# Altium footprint library MH_DA_THU_VIEN_16122016.PcbLib: 531 footprints (part 24 of 34)
Each footprint in its own frame and in the unit in brackets; x right, y up, seen from the top. Pads: shape width x height; smd on the part's side, far side on the other; paste and mask are expansions set on the pad; w line width, h text height; cw(c..) or ccw(c..) is an arc to the next point about the centre after c.
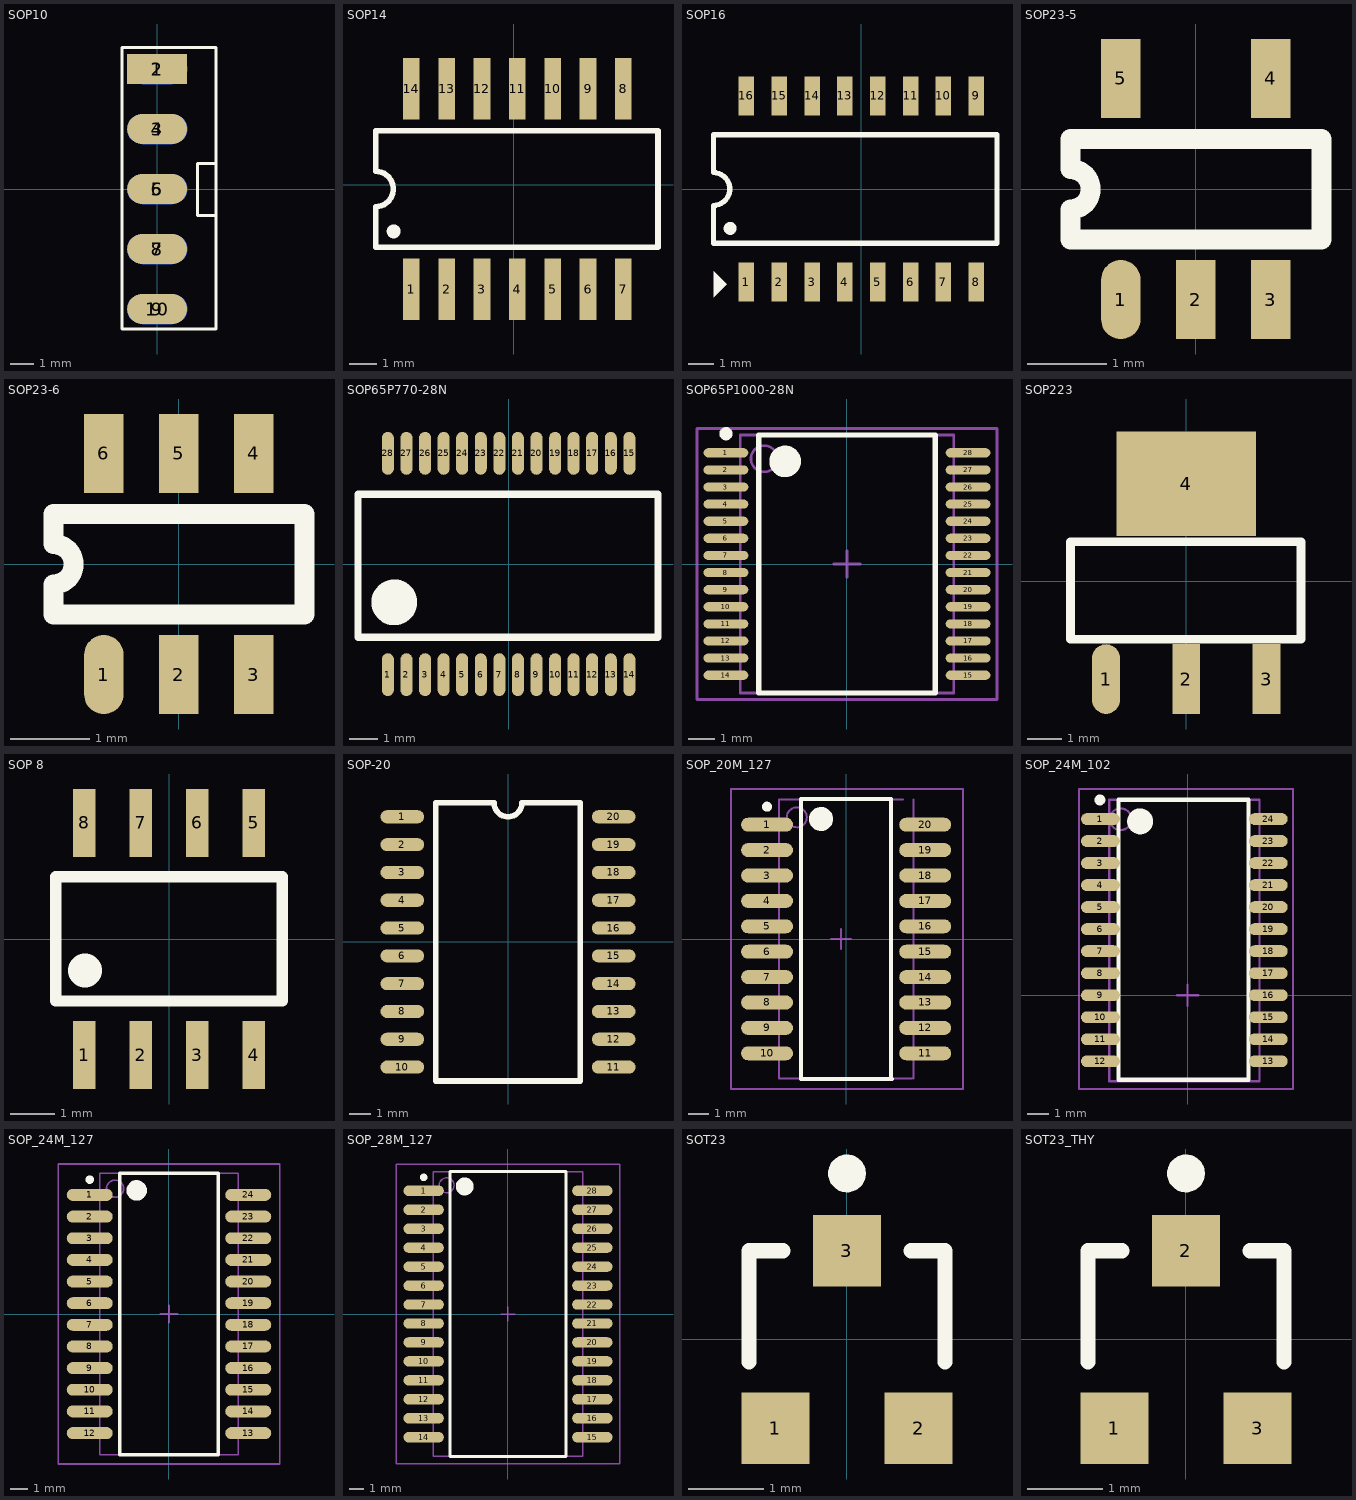
[diagram p23: the footprints below, top view; thin cyan lines are the x and y axes]

## SOP10 [mm] "SOIC 10 hai lop"
height 2.54
pads (10):
  rect 2.54x1.27 smd: 1(0,5.08)
  oval 2.54x1.27 smd far side: 2(0,5.08) 4(0,2.54) 6(0,0) 8(0,-2.54) 10(0,-5.08)
  oval 2.54x1.27 smd: 3(0,2.54) 5(0,0) 7(0,-2.54) 9(0,-5.08)
Top Overlay:
  lines w0.127: 2.497,5.077 2.5,5.075 2.5,-5.82 ; 2.5,-5.72 2.5,-5.92 -1.5,-5.92 -1.5,5.98 2.5,5.98 2.5,5.08 ; 2.5,-1.12 1.7,-1.12 1.7,1.08 2.5,1.08
Mechanical 15:
  lines w0.1: -0.5,5.08 0.5,5.08 ; 0,4.58 0,5.58

## SOP14 [mm]
pads (14):
  rect 0.6x2.2 smd: 1(-3.683,-3.752) 2(-2.413,-3.752) 3(-1.143,-3.752) 4(0.127,-3.752) 5(1.397,-3.752) 6(2.667,-3.752) 7(3.937,-3.752) 8(3.937,3.448) 9(2.667,3.448) 10(1.397,3.448) 11(0.127,3.448) 12(-1.143,3.448) 13(-2.413,3.448) 14(-3.683,3.448)
Top Overlay:
  circle w0.25: c-4.316,-1.676 r0.125
  lines w0.2: -4.963,-2.252 5.182,-2.252 5.182,1.948 -4.963,1.948 -4.963,0.483 cw(c-4.963,-0.152) -4.963,-0.787 -4.963,-2.252

## SOP16 [mm] "Small Outline; 16 Leads; Body Width 5.6 mm; Pitch 1.27 mm"
height 2
pads (16):
  rect 0.6x1.5 smd: 1(-4.445,-3.6) 2(-3.175,-3.6) 3(-1.905,-3.6) 4(-0.635,-3.6) 5(0.635,-3.6) 6(1.905,-3.6) 7(3.175,-3.6) 8(4.445,-3.6) 9(4.445,3.6) 10(3.175,3.6) 11(1.905,3.6) 12(0.635,3.6) 13(-0.635,3.6) 14(-1.905,3.6) 15(-3.175,3.6) 16(-4.445,3.6)
Top Overlay:
  circle w0.25: c-5.078,-1.524 r0.125
  region: -5.715,-4.191 -5.207,-3.683 -5.715,-3.175
  lines w0.2: -5.725,-2.1 -5.725,-0.635 ccw(c-5.725,0) -5.725,0.635 -5.725,2.1 5.25,2.1 5.25,-2.1 -5.725,-2.1
3D body: height 2.1, standoff 0, extent -5.22,-3.627 5.08,3.373

## SOP23-5 [mm]
pads (5):
  oval 0.5x1 smd: 1(-0.95,-1.4)
  rect 0.5x1 smd: 2(0,-1.4) 3(0.95,-1.4) 4(0.95,1.4) 5(-0.95,1.4)
Top Overlay:
  lines w0.254: -1.585,-0.638 -1.585,-0.257 ccw(c-1.585,-0.003) -1.585,0.251 -1.585,0.632 1.59,0.632 1.59,-0.638 -1.585,-0.638

## SOP23-6 [mm]
pads (6):
  oval 0.5x1 smd: 1(-0.95,-1.4)
  rect 0.5x1 smd: 2(0,-1.4) 3(0.95,-1.4) 4(0.95,1.4) 5(0,1.4) 6(-0.95,1.4)
Top Overlay:
  lines w0.254: -1.585,-0.638 -1.585,-0.257 ccw(c-1.585,-0.003) -1.585,0.251 -1.585,0.632 1.59,0.632 1.59,-0.638 -1.585,-0.638
3D body: height 1.45, standoff 0, extent -1.45,-1.4 1.45,1.4

## SOP65P770-28N [mil]
pads (28):
  oval 16.53x59.03 smd mask+7.9: 1(-166.35,-152.5) 2(-140.75,-152.5) 3(-115.17,-152.5) 4(-89.57,-152.5) 5(-63.98,-152.5) 6(-38.38,-152.5) 7(-12.78,-152.5) 8(12.8,-152.5) 9(38.4,-152.5) 10(64,-152.5) 11(89.58,-152.5) 12(115.18,-152.5) 13(140.77,-152.5) 14(166.35,-152.5) 15(166.35,152.5) 16(140.77,152.5) 17(115.18,152.5) 18(89.58,152.5) 19(64,152.5) 20(38.4,152.5) 21(12.8,152.5) 22(-12.78,152.5) 23(-38.38,152.5) 24(-63.98,152.5) 25(-89.57,152.5) 26(-115.17,152.5) 27(-140.75,152.5) 28(-166.35,152.5)
Top Overlay:
  circle w39.37: c-157.55,-52.8 r11.88
  lines w10: -207.57,-100.84 -207.57,96.03 205.86,96.03 205.86,-100.84 -207.57,-100.84
3D body: height 84.65, standoff 0, extent -203.36,-152.49 203.34,152.85

## SOP65P1000-28N [mm] "SOP, 28-Leads, Body 9.7x8mm, Pitch 0.65mm, IPC Medium Density"
height 2
pads (28):
  oval 1.7x0.35 smd: 1(-4.6,4.225) 2(-4.6,3.575) 3(-4.6,2.925) 4(-4.6,2.275) 5(-4.6,1.625) 6(-4.6,0.975) 7(-4.6,0.325) 8(-4.6,-0.325) 9(-4.6,-0.975) 10(-4.6,-1.625) 11(-4.6,-2.275) 12(-4.6,-2.925) 13(-4.6,-3.575) 14(-4.6,-4.225) 15(4.6,-4.225) 16(4.6,-3.575) 17(4.6,-2.925) 18(4.6,-2.275) 19(4.6,-1.625) 20(4.6,-0.975) 21(4.6,-0.325) 22(4.6,0.325) 23(4.6,0.975) 24(4.6,1.625) 25(4.6,2.275) 26(4.6,2.925) 27(4.6,3.575) 28(4.6,4.225)
Top Overlay:
  circle w0.6: c-2.35,3.9 r0.3
  circle w0.25: c-4.6,4.95 r0.125
  lines w0.2: -3.35,-4.9 3.35,-4.9 3.35,4.9 -3.35,4.9 -3.35,-4.9
Mechanical 13:
  circle w0.1: c-3.15,4 r0.5
  lines w0.1: -4.05,-4.9 4.05,-4.9 4.05,4.9 -4.05,4.9 -4.05,-4.9
Mechanical 15:
  lines w0.1: -0.5,0 0.5,0 ; 0,-0.5 0,0.5 ; -5.7,-5.15 5.7,-5.15 5.7,5.15 -5.7,5.15 -5.7,-5.15
3D body: height 2, standoff 0, extent -4.05,-4.9 4.05,4.9

## SOP223 [mm]
pads (4):
  oval 0.8x2 smd: 1(-2.3,-2.8)
  rect 0.8x2 smd: 2(0,-2.8) 3(2.3,-2.8)
  rect 4x3 smd: 4(0,2.8)
Top Overlay:
  lines w0.254: -3.316,-1.657 3.288,-1.657 3.288,1.137 -3.316,1.137 -3.316,-1.657

## SOP 8 [mil]
pads (8):
  rect 20x60 smd: 1(-75,-102.5) 2(-25,-102.5) 3(25,-102.5) 4(75,-102.5) 5(75,102.5) 6(25,102.5) 7(-25,102.5) 8(-75,102.5)
Top Overlay:
  lines w10: -100,-54.81 -100,55.12 100,55.12 100,-54.81 -100,-54.81
  lines w30: -74.03,-27.72 cw(c-78.05,-29.07) -74,-27.82
3D body: height 62.99, standoff 0, extent -97.81,-120.43 99.83,117.44

## SOP-20 [mm]
pads (20):
  oval 2x0.6 smd: 1(-4.826,5.715) 2(-4.826,4.445) 3(-4.826,3.175) 4(-4.826,1.905) 5(-4.826,0.635) 6(-4.826,-0.635) 7(-4.826,-1.905) 8(-4.826,-3.175) 9(-4.826,-4.445) 10(-4.826,-5.715) 11(4.826,-5.715) 12(4.826,-4.445) 13(4.826,-3.175) 14(4.826,-1.905) 15(4.826,-0.635) 16(4.826,0.635) 17(4.826,1.905) 18(4.826,3.175) 19(4.826,4.445) 20(4.826,5.715)
Top Overlay:
  lines w0.254: -3.302,-6.35 3.302,-6.35 3.302,6.35 0.635,6.35 cw(c0,6.35) -0.635,6.35 -3.302,6.35 -3.302,-6.35
3D body: height 2, standoff 0, extent -4.558,-7.112 4.572,7.186

## SOP_20M_127 [mm] "SOP, 20-Leads, Body 13.4x6.2mm, Pitch 1.27mm, IPC Low Density"
height 2
pads (20):
  oval 2.6x0.7 smd: 1(-3.954,5.715) 2(-3.954,4.445) 3(-3.954,3.175) 4(-3.954,1.905) 5(-3.954,0.635) 6(-3.954,-0.635) 7(-3.954,-1.905) 8(-3.954,-3.175) 9(-3.954,-4.445) 10(-3.954,-5.715) 11(3.954,-5.715) 12(3.954,-4.445) 13(3.954,-3.175) 14(3.954,-1.905) 15(3.954,-0.635) 16(3.954,0.635) 17(3.954,1.905) 18(3.954,3.175) 19(3.954,4.445) 20(3.954,5.715)
Top Overlay:
  circle w0.6: c-1.254,6 r0.3
  circle w0.25: c-3.954,6.615 r0.125
  lines w0.2: 2.159,7 -2.254,7 -2.254,-7 2.286,-7 ; 2.254,-7 2.254,7
Mechanical 13:
  circle w0.1: c-2.464,6.085 r0.5
  lines w0.1: 2.856,6.985 -3.364,6.985 -3.364,-6.985 3.302,-6.985 ; 3.364,-6.985 3.364,6.985
Mechanical 15:
  lines w0.1: -0.754,0 0.246,0 ; -0.254,-0.5 -0.254,0.5 ; -5.754,-7.5 5.842,-7.5 5.842,7.5 -5.754,7.5 -5.754,-7.5
3D body: height 2, standoff 0, extent -3.364,-6.985 3.302,6.985

## SOP_24M_102 [mm] "24-Pin Small Outline Package 1.02 mm Pitch"
height 2.64
pads (24):
  oval 1.8x0.55 smd: 1(-4.039,8.16) 2(-4.039,7.14) 3(-4.039,6.12) 4(-4.039,5.1) 5(-4.039,4.08) 6(-4.039,3.06) 7(-4.039,2.04) 8(-4.039,1.02) 9(-4.039,0) 10(-4.039,-1.02) 11(-4.039,-2.04) 12(-4.039,-3.06) 13(3.734,-3.06) 14(3.734,-2.04) 15(3.734,-1.02) 16(3.734,0) 17(3.734,1.02) 18(3.734,2.04) 19(3.734,3.06) 20(3.734,4.08) 21(3.734,5.1) 22(3.734,6.12) 23(3.734,7.14) 24(3.734,8.16)
Top Overlay:
  circle w0.6: c-2.2,8.05 r0.3
  circle w0.25: c-4.062,9.042 r0.125
  lines w0.2: -3.2,-3.912 2.819,-3.912 2.819,9.05 -3.2,9.05 -3.2,-3.912
Mechanical 13:
  circle w0.1: c-3.1,8.15 r0.5
  lines w0.1: -3.632,-3.988 3.327,-3.988 3.327,9.05 -3.632,9.05 -3.632,-3.988
Mechanical 15:
  lines w0.1: -0.5,0 0.5,0 ; 0,-0.5 0,0.5 ; -5.029,-4.343 4.877,-4.343 4.877,9.55 -5.029,9.55 -5.029,-4.343
3D body: height 2.64, standoff 0, extent -3.632,-3.937 3.353,9.05

## SOP_24M_127 [mm] "SOP, 24-Leads, Body 15.6x8.1mm, Pitch 1.27mm, IPC Low Density"
height 2.5
pads (24):
  oval 2.7x0.7 smd: 1(-4.65,6.985) 2(-4.65,5.715) 3(-4.65,4.445) 4(-4.65,3.175) 5(-4.65,1.905) 6(-4.65,0.635) 7(-4.65,-0.635) 8(-4.65,-1.905) 9(-4.65,-3.175) 10(-4.65,-4.445) 11(-4.65,-5.715) 12(-4.65,-6.985) 13(4.65,-6.985) 14(4.65,-5.715) 15(4.65,-4.445) 16(4.65,-3.175) 17(4.65,-1.905) 18(4.65,-0.635) 19(4.65,0.635) 20(4.65,1.905) 21(4.65,3.175) 22(4.65,4.445) 23(4.65,5.715) 24(4.65,6.985)
Top Overlay:
  circle w0.6: c-1.9,7.25 r0.3
  circle w0.25: c-4.65,7.885 r0.125
  lines w0.2: -2.9,-8.25 2.9,-8.25 2.9,8.25 -2.9,8.25 -2.9,-8.25
Mechanical 13:
  circle w0.1: c-3.165,7.355 r0.5
  lines w0.1: -4.065,-8.255 4.065,-8.255 4.065,8.255 -4.065,8.255 -4.065,-8.255
Mechanical 15:
  lines w0.1: -0.5,0 0.5,0 ; 0,-0.5 0,0.5 ; -6.5,-8.8 6.5,-8.8 6.5,8.8 -6.5,8.8 -6.5,-8.8
3D body: height 2.79, standoff 2.54, extent -0.542,7.18 0.615,7.696
3D body: height 2.79, standoff 0.25, extent -2.654,6.318 -1.778,7.118
3D body: height 2.7, standoff -0.11, extent -4.949,-7.853 5.051,7.747

## SOP_28M_127 [mm] "SOP, 28-Leads, Body 18.1x8.6mm, Pitch 1.27mm, IPC Low Density"
height 3.05
pads (28):
  oval 2.7x0.7 smd: 1(-5.65,8.255) 2(-5.65,6.985) 3(-5.65,5.715) 4(-5.65,4.445) 5(-5.65,3.175) 6(-5.65,1.905) 7(-5.65,0.635) 8(-5.65,-0.635) 9(-5.65,-1.905) 10(-5.65,-3.175) 11(-5.65,-4.445) 12(-5.65,-5.715) 13(-5.65,-6.985) 14(-5.65,-8.255) 15(5.65,-8.255) 16(5.65,-6.985) 17(5.65,-5.715) 18(5.65,-4.445) 19(5.65,-3.175) 20(5.65,-1.905) 21(5.65,-0.635) 22(5.65,0.635) 23(5.65,1.905) 24(5.65,3.175) 25(5.65,4.445) 26(5.65,5.715) 27(5.65,6.985) 28(5.65,8.255)
Top Overlay:
  circle w0.6: c-2.9,8.55 r0.3
  circle w0.25: c-5.65,9.155 r0.125
  lines w0.2: -3.9,-9.55 3.9,-9.55 3.9,9.55 -3.9,9.55 -3.9,-9.55
Mechanical 13:
  circle w0.1: c-4.115,8.625 r0.5
  lines w0.1: -5.015,-9.525 5.015,-9.525 5.015,9.525 -5.015,9.525 -5.015,-9.525
Mechanical 15:
  lines w0.1: -0.5,0 0.5,0 ; 0,-0.5 0,0.5 ; -7.5,-10.05 7.5,-10.05 7.5,10.05 -7.5,10.05 -7.5,-10.05
3D body: height 2.64, standoff 0, extent -5.336,-9.04 5.334,9.04

## SOT23 [mm] "SOT-23; 3 Leads; Body 3.1 x 2.5 mm, inc. leads (LxW max), Alternate Lead Configuration"
height 1.1
pads (3):
  rect 0.9x0.95 smd: 1(-0.95,-1.175) 2(0.95,-1.175) 3(0,1.175)
Top Overlay:
  circle w0.25: c0,2.2 r0.125
  lines w0.2: -1.3,-0.3 -1.3,1.175 -0.85,1.175 ; 0.85,1.175 1.3,1.175 1.3,-0.3
3D body: height 1.05, standoff -0.05, extent -1.5,-1.25 1.5,1.25

## SOT23_THY [mm] "SOT-23; 3 Leads; Body 3.1 x 2.5 mm, inc. leads (LxW max), Alternate Lead Configuration"
height 1.1
pads (3):
  rect 0.9x0.95 smd: 1(-0.95,-1.175) 2(0,1.175) 3(0.95,-1.175)
Top Overlay:
  circle w0.25: c0,2.2 r0.125
  lines w0.2: -1.3,-0.3 -1.3,1.175 -0.85,1.175 ; 0.85,1.175 1.3,1.175 1.3,-0.3
3D body: height 1.05, standoff -0.05, extent -1.5,-1.25 1.5,1.25